# Altium integrated library komponenty_ITS_v1.IntLib: 126 symbols
Pins are listed as number, name and electrical type; pins without a type are passive.

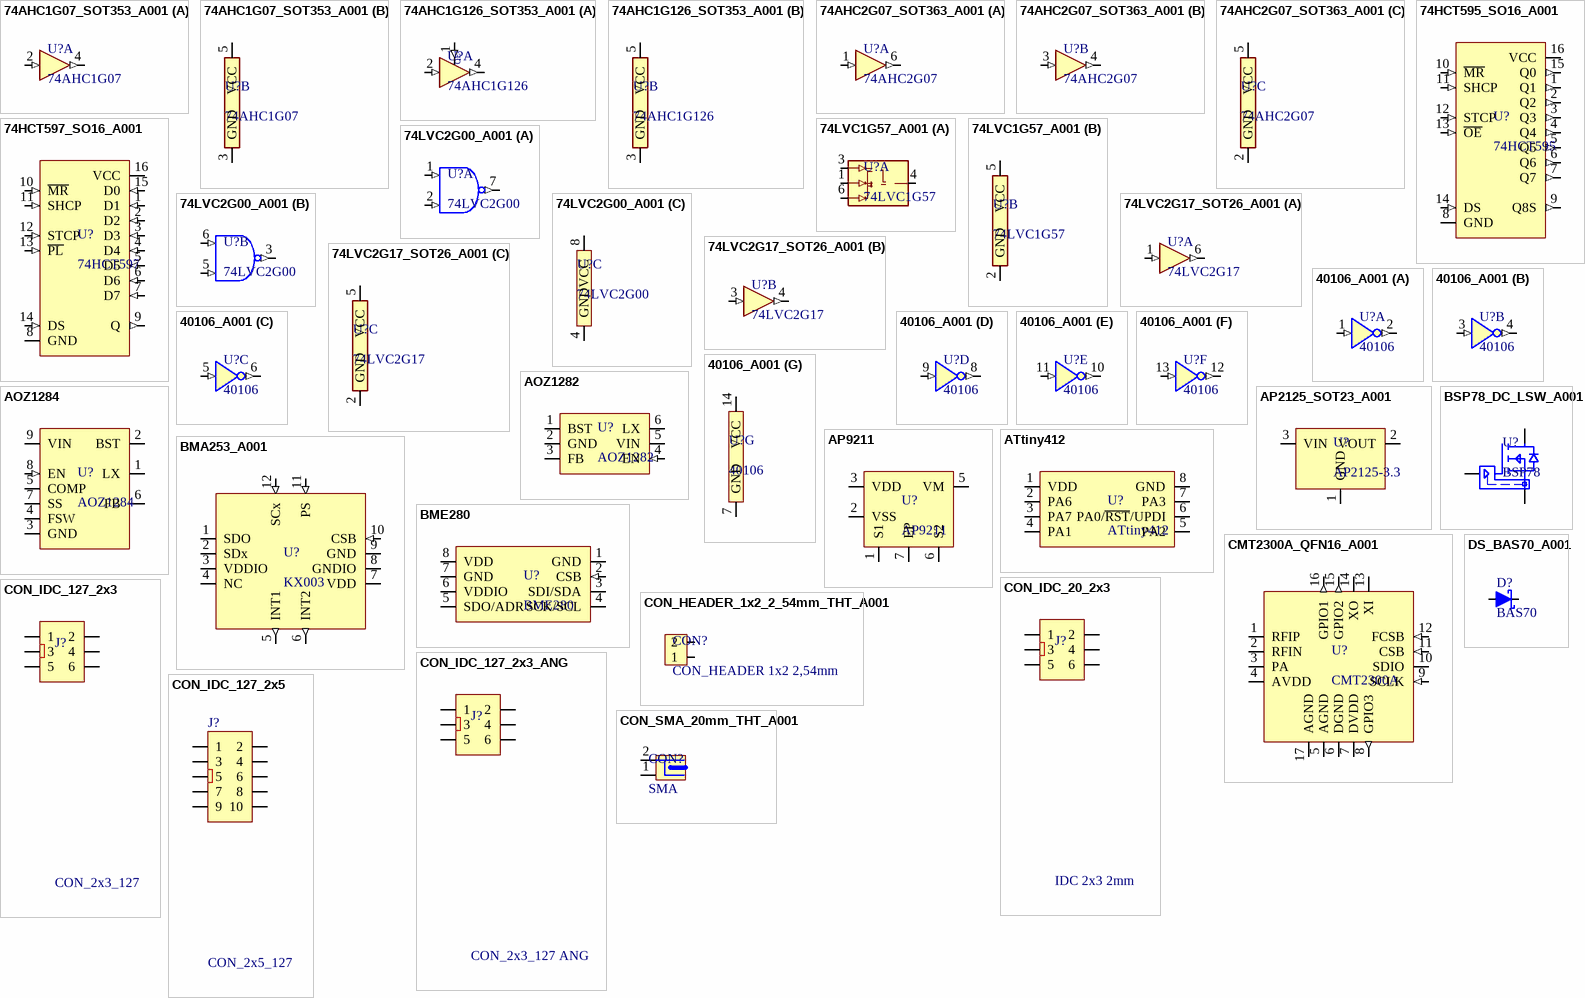
[diagram p0: symbols 74AHC1G07_SOT353_A001 to DS_BAS70_A001]

## 74AHC1G07_SOT353_A001
designator U?, comment 74AHC1G07
buffer OC; ITSN: IC_74AHC1G126_SOT353_A001
footprint SOT353
part A pins: 2 A1 (in), 4 Y1 (out)
part B pins: 3 GND (power), 5 VCC (power)

## 74AHC1G126_SOT353_A001
designator U?, comment 74AHC1G126
buffer with enable; ITSN: IC_74AHC1G126_SOT353_A001
footprint SOT353
part A pins: 1 OE (in), 2 A1 (in), 4 Y1 (out)
part B pins: 3 GND (power), 5 VCC (power)

## 74AHC2G07_SOT363_A001
designator U?, comment 74AHC2G07
2x buffer OC; ITSN: IC_74AHC2G07_SOT363_A001
footprint SOT363
part A pins: 1 A1 (in), 6 Y1 (out)
part B pins: 3 A2 (in), 4 Y2 (out)
part C pins: 2 GND (power), 5 VCC (power)

## 74HCT595_SO16_A001
designator U?, comment 74HCT595
8-b serial to parallel shift register; ITSN: IC_74HCT595_SO16_A001
footprint SO-16 (SOIC, 16-Leads, Body 10,0x4,0mm (max), Pitch 1,27mm, IPC Low Density)
pins: 1 Q1 (out), 2 Q2 (out), 3 Q3 (out), 4 Q4 (out), 5 Q5 (out), 6 Q6 (out), 7 Q7 (out), 8 GND (power), 9 Q8S (out), 10 ~{MR} (in), 11 SHCP (in), 12 STCP (in), 13 ~{OE} (in), 14 DS (in), 15 Q0 (out), 16 VCC (power)

## 74HCT597_SO16_A001
designator U?, comment 74HCT597
8-b parallel  to serial shift register; ITSN: IC_74HCT597_SO16_A001
footprint SO-16 (SOIC, 16-Leads, Body 10,0x4,0mm (max), Pitch 1,27mm, IPC Low Density)
pins: 1 D1 (in), 2 D2 (in), 3 D3 (in), 4 D4 (in), 5 D5 (in), 6 D6 (in), 7 D7 (in), 8 GND (power), 9 Q (out), 10 ~{MR} (in), 11 SHCP (in), 12 STCP (in), 13 ~{PL} (in), 14 DS (in), 15 D0 (in), 16 VCC (power)

## 74LVC1G57_A001
designator U?, comment 74LVC1G57
multiple function gate; ITSN: IC_74LVC1G57GW_SOT363_A001
footprint SOT363
part A pins: 1 B, 3 A, 4 Y, 6 C
part B pins: 2 GND (power), 5 VCC (power)

## 74LVC2G00_A001
designator U?, comment 74LVC2G00
MAND GATE; ITSN: IC_74LVC2G00_VSSOP-8_A001
footprint VSSOP-8
part A pins: 1 A1 (in), 2 B1 (in), 7 OUT_1 (out)
part B pins: 3 OUT_2 (out), 5 B2 (in), 6 A2 (in)
part C pins: 4 GND (power), 8 VCC (power)

## 74LVC2G17_SOT26_A001
designator U?, comment 74LVC2G17
buffer with shmitt; ITSN: IC_74LVC2G17_SOT26_A001
footprint SOT23-6 (Zetex)
part A pins: 1 A1 (in), 6 Y1 (out)
part B pins: 3 A2 (in), 4 Y2 (out)
part C pins: 2 GND (power), 5 VCC (power)

## 40106_A001
designator U?, comment 40106
6 x inverter; ITSN: IC_40106_SO-16_A001
footprint SO-14
part A pins: 1 A1 (in), 2 ~{Y1} (out)
part B pins: 3 A2 (in), 4 ~{Y2} (out)
part C pins: 5 A3 (in), 6 ~{Y3} (out)
part D pins: 8 ~{Y4} (out), 9 A4 (in)
part E pins: 10 ~{Y5} (out), 11 A5 (in)
part F pins: 12 ~{Y6} (out), 13 A6 (in)
part G pins: 7 GND (power), 14 VCC (power)

## AOZ1282
designator U?
DC/DC 1,2A 36V 500kHz SOT23-6; ITSN: IC_AOZ1282_SOT23-6_A001
footprint SOT23-6 (Zetex)
pins: 1 BST, 2 GND (power), 3 FB, 4 EN (in), 5 VIN (power), 6 LX

## AOZ1284
designator U?
3.0V to 36V 4A step-down; ITSN: IC_AOZ1284_SO8EP_A001
footprint SO-8T
pins: 1 LX, 2 BST, 3 GND (power), 4 FSW, 5 COMP, 6 FB, 7 SS, 8 EN (in), 9 VIN (power)

## AP2125_SOT23_A001
designator U?, comment AP2125-3.3
Multi komponent 2.2-3.3 V 100mA Iq<65uA; ITSN: IC_LIN_REG_MULTI_SOT23_A001
footprint SOT-23
pins: 1 GND (power), 2 VOUT (power), 3 VIN (power)

## AP9211
designator U?
single chip protection for 1-CELL Li+ battery; ITSN: IC_AP9211_UDFN-6_A001
footprint U-DFN2030-6 (DIODEC modyfied DFN-6)
pins: 1 S1, 2 VSS (power), 3 VDD (power), 5 VM, 6 S2, 7 EP

## ATtiny412
designator U?
tinyAVR 1-series 4k/256 8pin; ITSN: IC_ATTINY412_A001
footprint SO-8
pins: 1 VDD (power), 2 PA6 (io), 3 PA7 (io), 4 PA1 (io), 5 PA2 (io), 6 PA0/~{RST}/UPDI (io), 7 PA3 (io), 8 GND (power)

## BMA253_A001
designator U?, comment KX003
KX003-1077
footprint LGA-12_ACC_BOSCH (LGA, 12-Leads, Body 2,00x2,00mmx0,70mm, Pitch 0,50mm)
pins: 1 SDO (io), 2 SDx (io), 3 VDDIO, 4 NC, 5 INT1 (out), 6 INT2 (out), 7 VDD (power), 8 GNDIO (power), 9 GND (power), 10 CSB (in), 11 PS (in), 12 SCx (in)

## BME280
designator U?
BME280 BOSCH, humidity, pressure and temperature sensor.; ITSN: IC_BME280_LGA8_A001
footprint LGA_8 (BME280 bosh)
pins: 1 GND (power), 2 CSB (in), 3 SDI/SDA (io), 4 SCK/SCL (io), 5 SDO/ADR (io), 6 VDDIO (power), 7 GND (power), 8 VDD (power)

## BSP78_DC_LSW_A001
designator U?, comment BSP78
Low side protected MOSFET; ITSN: IC_BSP78_SOT223_A001
footprint SOT-223
pins: 1 G, 2 D, 3 S

## CMT2300A_QFN16_A001
designator U?, comment CMT2300A
RF Transciver sub Giga CEMOSTEK CMT2300A QFN16
footprint QFN_16_3x3_A001 (CMOSTEK)
pins: 1 RFIP, 2 RFIN, 3 PA, 4 AVDD (power), 5 AGND (power), 6 DGND (power), 7 DVDD (power), 8 GPIO3 (out), 9 SCLK (in), 10 SDIO (io), 11 CSB (in), 12 FCSB (in), 13 XI, 14 XO, 15 GPIO2 (out), 16 GPIO1 (out), 17 AGND (power)

## CON_HEADER_1x2_2_54mm_THT_A001
designator CON?, comment CON_HEADER 1x2 2,54mm
footprint CON_HEADER_1x2_2.54_THT_A001
pins: 1, 2

## CON_IDC_20_2x3
designator J?, comment IDC 2x3 2mm
IDC THT 2mm 2x3
footprint IDC_2_0_2x3_THT (IDC 2x3 2mm THT)
pins: 1, 2, 3, 4, 5, 6

## CON_IDC_127_2x3
designator J?, comment CON_2x3_127
Connector
footprint IDC_1_27_2x3_SMT (IDC 2x3 1,27 mm SMT OEM)
pins: 1, 2, 3, 4, 5, 6

## CON_IDC_127_2x3_ANG
designator J?, comment CON_2x3_127 ANG
Connector 1,27mm ANG
footprint IDC_1_27_2x3_THT_angle (IDC 2x3 1,27 mm THT angle)
pins: 1, 2, 3, 4, 5, 6

## CON_IDC_127_2x5
designator J?, comment CON_2x5_127
Connector
footprint IDC_1_27_2x5_SMT (IDC 2x5 1,27 mm SMT OEM)
pins: 1, 2, 3, 4, 5, 6, 7, 8, 9, 10

## CON_SMA_20mm_THT_A001
designator CON?, comment SMA
ITSN: CON_SMA_20mm_THT_A001
footprint SMA_THT_20mm_A001
pins: 1, 2

## DS_BAS70_A001
designator D?, comment BAS70
BAS70 Schottky switching diode single, 70mA 70V; ITSN: DS_BAS70_SOD-523_A001
footprint SOD-523
pins: 1 A, 2 K

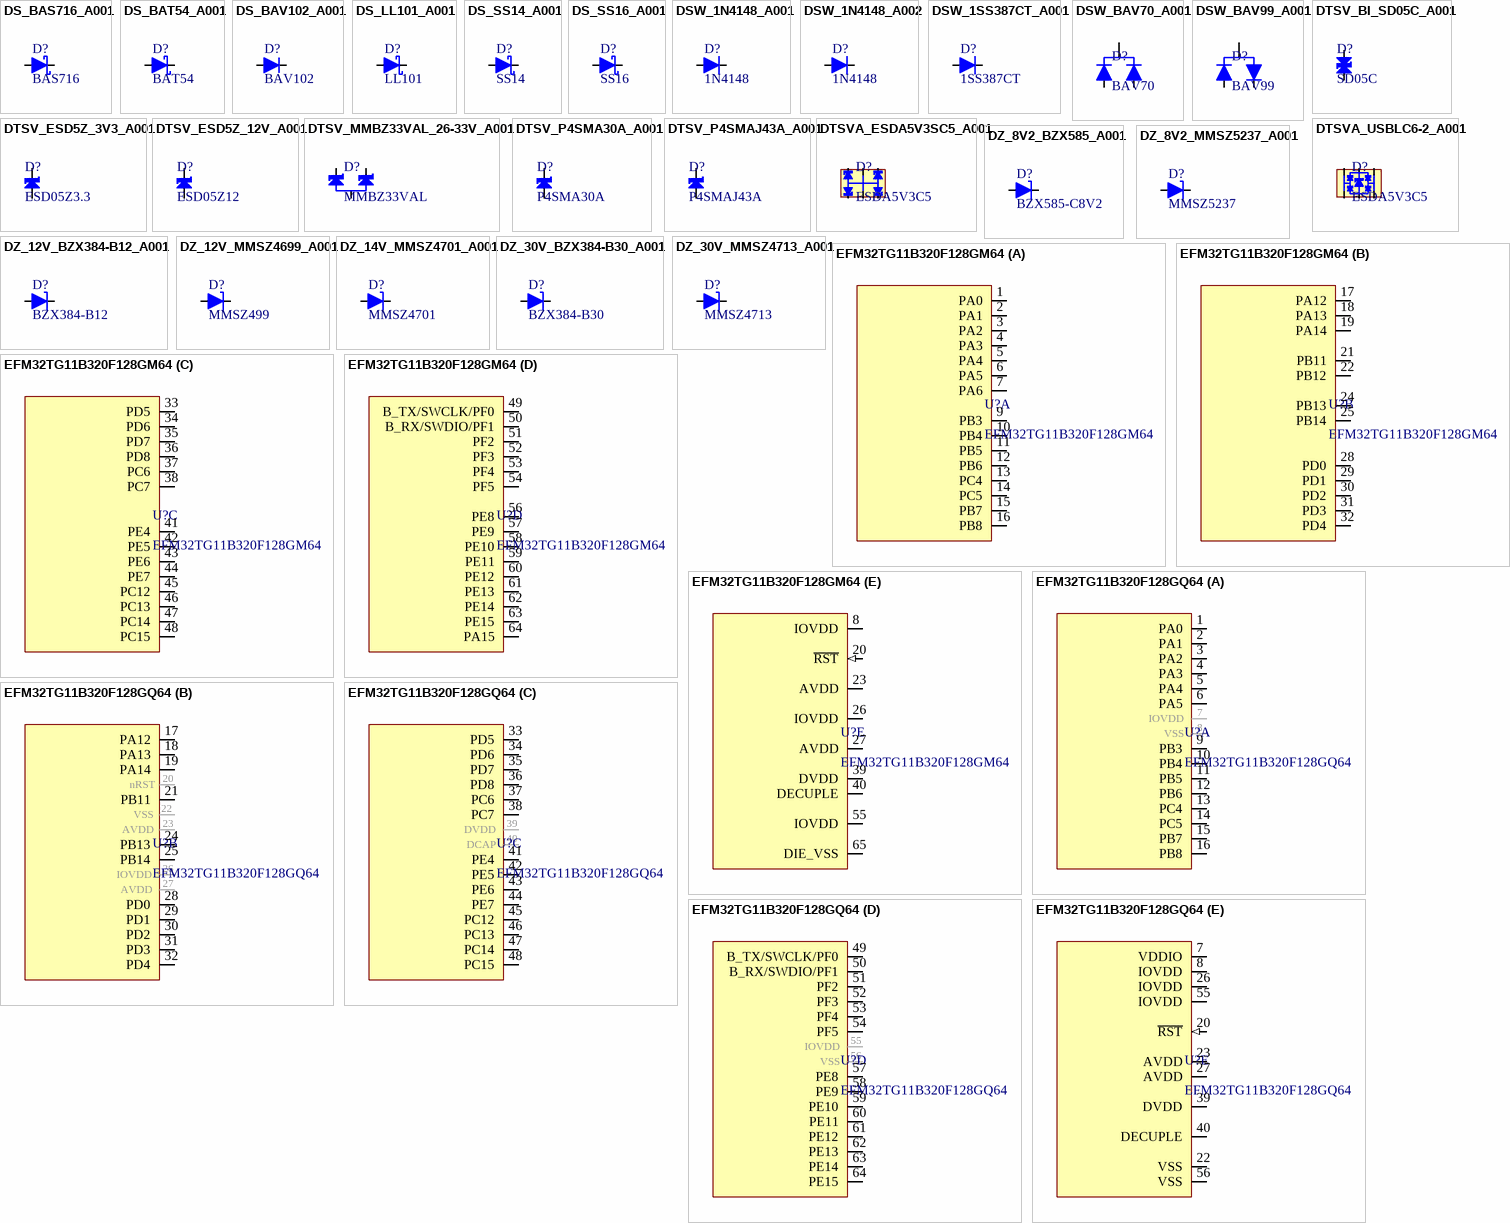
[diagram p1: symbols DS_BAS716_A001 to EFM32TG11B320F128GQ64]

## DS_BAS716_A001
designator D?, comment BAS716
BAS716 low-leakage diode single, 0,2A 75V; ITSN: DS_BAS716_SOD523_A001
footprint SOD-523
pins: 1 A, 2 K

## DS_BAT54_A001
designator D?, comment BAT54
BAT54 Schottky diode single, 0,2A 30V; ITSN: DS_BAT54_SOD523_A001
footprint SOD-523
pins: 1 A, 2 K

## DS_BAV102_A001
designator D?, comment BAV102
BAV102 switching diode 50ns 200V 0,25A; ITSN: DS_BAV102_SOD-80_A001
footprint SOD-80 (miniMELF)
pins: 1 A, 2 K

## DS_LL101_A001
designator D?, comment LL101
LL101 Schottky diode switch 1ns, 15mA 40V; ITSN: DS_LL101_SOD-80_A001
footprint SOD-80 (miniMELF)
pins: 1 A, 2 K

## DS_SS14_A001
designator D?, comment SS14
SS14 Schottky 40V 1A DO214AC (SMA); ITSN: DS_SS14_1A_40V_DO214AC_A001
footprint DO214AC
pins: 1 A, 2 K

## DS_SS16_A001
designator D?, comment SS16
SS16 Schottky 60V 1A DO214AC (SMA); ITSN: DS_SS16_1A_60V_DO214AC_A001
footprint DO214AC
pins: 1 A, 2 K

## DSW_1N4148_A001
designator D?, comment 1N4148
1N4148 75V 150mA; ITSN: DSW_1N4148_SOD523_A001
footprint SOD-523 (SC-79)
pins: 1 A, 2 K

## DSW_1N4148_A002
designator D?, comment 1N4148
1N4148 75V 150mA; ITSN: DSW_1N4148_MicroMELF_A001
footprint microMELF (MELF Diode, 2-Leads, Body 1,90x1,15mm, IPC Medium Density)
pins: 1 A, 2 K

## DSW_1SS387CT_A001
designator D?, comment 1SS387CT
1SS387CT 85V 100mA 1,6ns 0,5pF; ITSN: DSW_1SS387CT_80V_0A2_SOD-882_A001
footprint SOD-882
pins: 1 A, 2 K

## DSW_BAV70_A001
designator D?, comment BAV70
switching diode BAV70 100V 200mA 4ns; ITSN: DSW_BAV70_100V_0A2_SOT23_A001
footprint SOT-23
pins: 1 A1, 2 A2, 3

## DSW_BAV99_A001
designator D?, comment BAV99
switching diode BAV99 100V 200mA 4ns; ITSN: DSW_BAV99_100V_0A2_SOT23_A001
footprint SOT-23
pins: 1 A, 2 K, 3

## DTSV_BI_SD05C_A001
designator D?, comment SD05C
Single Line TVS Diode  5V; ITSN: DTSV_SD05C_BI_5V_24A_SOD-323_A001
footprint SOD-323
pins: 1, 2

## DTSV_ESD5Z_3V3_A001
designator D?, comment ESD05Z3.3
3V3 Single Line TVS Diode; ITSN: DTSV_ESD5Z3.3_3V3_11A2_SOD-523_A001
footprint SOD-523
pins: 1 A, 2 K

## DTSV_ESD5Z_12V_A001
designator D?, comment ESD05Z12
12V Single Line TVS Diode; ITSN: DTSV_ESD5Z12T1G_12V_9A_SOD-523_A001
footprint SOD-523
pins: 1 A, 2 K

## DTSV_MMBZ33VAL_26-33V_A001
designator D?, comment MMBZ33VAL
26-33V Dual Line TVS Diode; ITSN: DTSV_MMBZ33_26-33V_SOT23_A001
footprint SOT-23
pins: 1 K, 2 K, 3 CA

## DTSV_P4SMA30A_A001
designator D?, comment P4SMA30A
Single Line TVS Diode  30V 10A; ITSN: DTSV_P4SMA30A_30V_DO214AC_A001
footprint DO214AC
pins: 1 A, 2 K

## DTSV_P4SMAJ43A_A001
designator D?, comment P4SMAJ43A
Single Line TVS Diode  43V 10A; ITSN: DTSV_P4SMAJ43A_43V_DO214AC_A001
footprint DO214AC
pins: 1 A, 2 K

## DTSVA_ESDA5V3SC5_A001
designator D?, comment ESDA5V3C5
Quad TSV array 5V3; ITSN: DTSVA_ESDA5V3SC5_5V9_22A_SOT23-6_A001
footprint SOT23-6 (Zetex)
pins: 1, 2, 3, 4, 5, 6

## DTSVA_USBLC6-2_A001
designator D?, comment ESDA5V3C5
Quad TSV array 5V3; ITSN: DTSVA_USBLC6_SOT-26_A001
footprint SOT23-6 (Zetex)
pins: 1, 2, 3, 4, 5, 6

## DZ_8V2_BZX585_A001
designator D?, comment BZX585-C8V2
8V2 Zener, SOD-523; ITSN: DZ_8V2_BZX585_SOD-523_A001
footprint SOD-523 (SC-79)
pins: 1 A, 2 K

## DZ_8V2_MMSZ5237_A001
designator D?, comment MMSZ5237
8V2 Zener, SOD-323; ITSN: DZ_8V2_MMSZ5237_SOD323_A001
footprint SOD-323
pins: 1 A, 2 K

## DZ_12V_BZX384-B12_A001
designator D?, comment BZX384-B12
12V Zener Iz=50uA SOD-323; ITSN: DZ_12V_BZX384_SOD323_A001
footprint SOD-323
pins: 1 A, 2 K

## DZ_12V_MMSZ4699_A001
designator D?, comment MMSZ499
12V Zener Iz=50uA SOD-123; ITSN: DZ_12V_MMSZ4699_SOD-123_A001
footprint SOD-123
pins: 1 A, 2 K

## DZ_14V_MMSZ4701_A001
designator D?, comment MMSZ4701
14V Zener Iz=50uA SOD-123; ITSN: DZ_14V_MMSZ4701_SOD-123_A001
footprint SOD-123
pins: 1 A, 2 K

## DZ_30V_BZX384-B30_A001
designator D?, comment BZX384-B30
30V Zener Iz=50uA SOD-323; ITSN: DZ_30V_BZX384_SOD323_A001
footprint SOD-323
pins: 1 A, 2 K

## DZ_30V_MMSZ4713_A001
designator D?, comment MMSZ4713
30V Zener Iz=50uA SOD-123; ITSN: DZ_30V_MMSZ4713_SOD-123_A001
footprint SOD-123
pins: 1 A, 2 K

## EFM32TG11B320F128GM64
designator U?
EFM32TG11 FAMILY: EFM32TG11B3XX; ITSN: IC_EFM32TG11B320_QFN64_A001
footprint QFN64_A001 (GECO SILICON LABS)
part A pins: 1 PA0 (io), 2 PA1 (io), 3 PA2 (io), 4 PA3 (io), 5 PA4 (io), 6 PA5 (io), 7 PA6 (io), 9 PB3 (io), 10 PB4 (io), 11 PB5 (io), 12 PB6 (io), 13 PC4 (io), 14 PC5 (io), 15 PB7 (io), 16 PB8 (io)
part B pins: 17 PA12 (io), 18 PA13 (io), 19 PA14 (io), 21 PB11 (io), 22 PB12 (io), 24 PB13 (io), 25 PB14 (io), 28 PD0 (io), 29 PD1 (io), 30 PD2 (io), 31 PD3 (io), 32 PD4 (io)
part C pins: 33 PD5 (io), 34 PD6 (io), 35 PD7 (io), 36 PD8 (io), 37 PC6 (io), 38 PC7 (io), 41 PE4 (io), 42 PE5 (io), 43 PE6 (io), 44 PE7 (io), 45 PC12 (io), 46 PC13 (io), 47 PC14 (io), 48 PC15 (io)
part D pins: 49 B_TX/SWCLK/PF0 (io), 50 B_RX/SWDIO/PF1 (io), 51 PF2 (io), 52 PF3 (io), 53 PF4 (io), 54 PF5 (io), 56 PE8 (io), 57 PE9 (io), 58 PE10 (io), 59 PE11 (io), 60 PE12 (io), 61 PE13 (io), 62 PE14 (io), 63 PE15 (io), 64 PA15 (io)
part E pins: 8 IOVDD (power), 20 ~{RST} (in), 23 AVDD (power), 26 IOVDD (power), 27 AVDD (power), 39 DVDD (power), 40 DECUPLE, 55 IOVDD (power), 65 DIE_VSS

## EFM32TG11B320F128GQ64
designator U?
EFM32TG11 FAMILY: EFM32TG11B3XX LQFP64; ITSN: IC_EFM32TG11B320_QFP64_A001
footprint LQFP64_small (TSQFP, 64-Leads, Body 10,00x10,00mm, Pitch 0,50mm)
part A pins: 1 PA0 (io), 2 PA1 (io), 3 PA2 (io), 4 PA3 (io), 5 PA4 (io), 6 PA5 (io), 9 PB3 (io), 10 PB4 (io), 11 PB5 (io), 12 PB6 (io), 13 PC4 (io), 14 PC5 (io), 15 PB7 (io), 16 PB8 (io)
part B pins: 17 PA12 (io), 18 PA13 (io), 19 PA14 (io), 21 PB11 (io), 24 PB13 (io), 25 PB14 (io), 28 PD0 (io), 29 PD1 (io), 30 PD2 (io), 31 PD3 (io), 32 PD4 (io)
part C pins: 33 PD5 (io), 34 PD6 (io), 35 PD7 (io), 36 PD8 (io), 37 PC6 (io), 38 PC7 (io), 41 PE4 (io), 42 PE5 (io), 43 PE6 (io), 44 PE7 (io), 45 PC12 (io), 46 PC13 (io), 47 PC14 (io), 48 PC15 (io)
part D pins: 49 B_TX/SWCLK/PF0 (io), 50 B_RX/SWDIO/PF1 (io), 51 PF2 (io), 52 PF3 (io), 53 PF4 (io), 54 PF5 (io), 57 PE8 (io), 58 PE9 (io), 59 PE10 (io), 60 PE11 (io), 61 PE12 (io), 62 PE13 (io), 63 PE14 (io), 64 PE15 (io)
part E pins: 7 VDDIO (power), 8 IOVDD (power), 20 ~{RST} (in), 22 VSS (power), 23 AVDD (power), 26 IOVDD (power), 27 AVDD (power), 39 DVDD (power), 40 DECUPLE, 55 IOVDD (power), 56 VSS (power)
part B text: nRST
part C text: DCAP

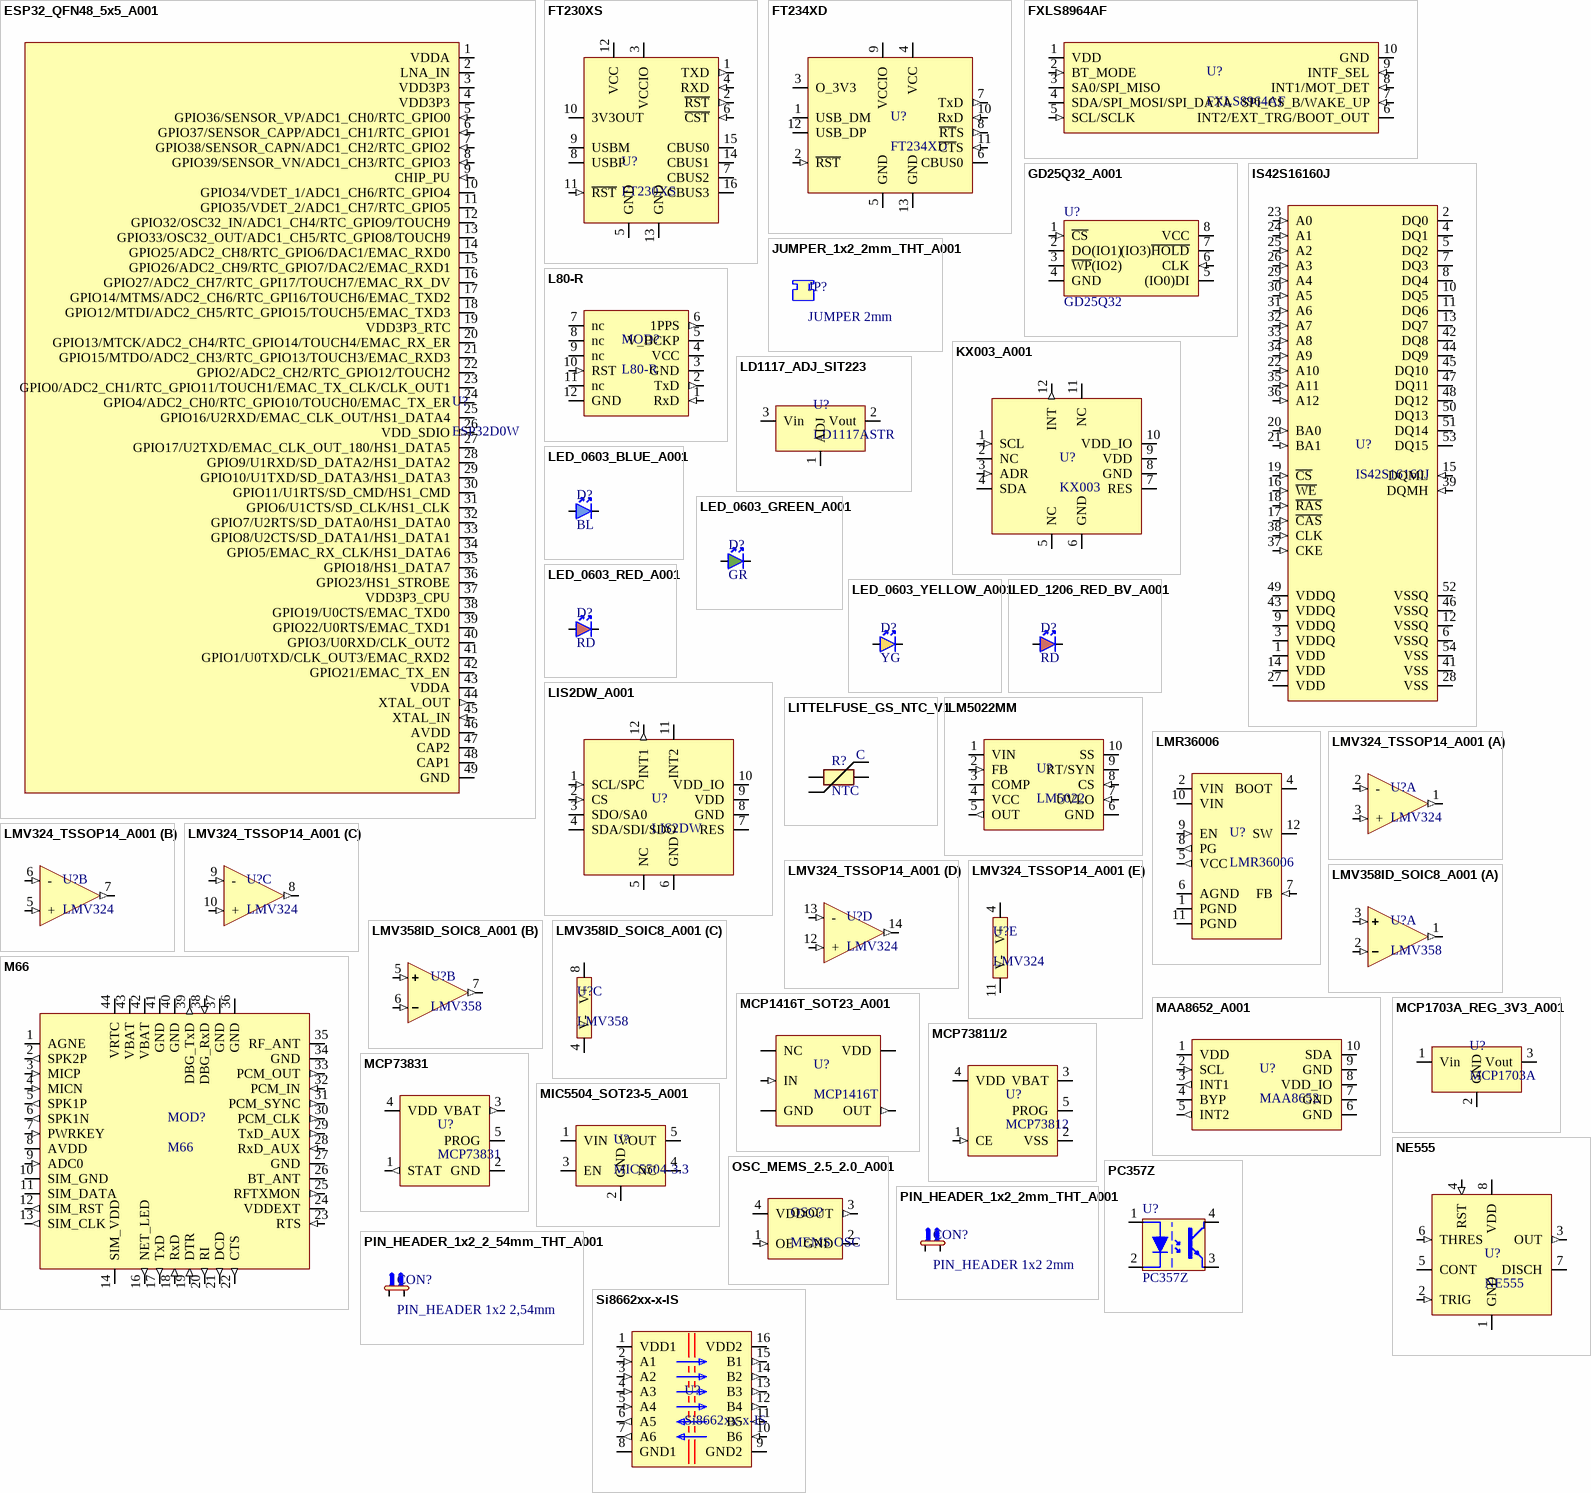
[diagram p2: symbols ESP32_QFN48_5x5_A001 to Si8662xx-x-IS]

## ESP32_QFN48_5x5_A001
designator U?, comment ESP32D0W
ESP32 QFN48 5x5; ITSN: IC_ESP32D0W_QFN48_A001
footprint QFN48_5_5_v1 (QFN48 5x5)
pins: 1 VDDA (power), 2 LNA_IN, 3 VDD3P3 (power), 4 VDD3P3 (power), 5 GPIO36/SENSOR_VP/ADC1_CH0/RTC_GPIO0 (in), 6 GPIO37/SENSOR_CAPP/ADC1_CH1/RTC_GPIO1 (in), 7 GPIO38/SENSOR_CAPN/ADC1_CH2/RTC_GPIO2 (in), 8 GPIO39/SENSOR_VN/ADC1_CH3/RTC_GPIO3 (in), 9 CHIP_PU (in), 10 GPIO34/VDET_1/ADC1_CH6/RTC_GPIO4 (io), 11 GPIO35/VDET_2/ADC1_CH7/RTC_GPIO5 (io), 12 GPIO32/OSC32_IN/ADC1_CH4/RTC_GPIO9/TOUCH9 (io), 13 GPIO33/OSC32_OUT/ADC1_CH5/RTC_GPIO8/TOUCH9 (io), 14 GPIO25/ADC2_CH8/RTC_GPIO6/DAC1/EMAC_RXD0 (io), 15 GPIO26/ADC2_CH9/RTC_GPIO7/DAC2/EMAC_RXD1 (io), 16 GPIO27/ADC2_CH7/RTC_GPI17/TOUCH7/EMAC_RX_DV (io), 17 GPIO14/MTMS/ADC2_CH6/RTC_GPI16/TOUCH6/EMAC_TXD2 (io), 18 GPIO12/MTDI/ADC2_CH5/RTC_GPIO15/TOUCH5/EMAC_TXD3 (io), 19 VDD3P3_RTC (power), 20 GPIO13/MTCK/ADC2_CH4/RTC_GPIO14/TOUCH4/EMAC_RX_ER (io), 21 GPIO15/MTDO/ADC2_CH3/RTC_GPIO13/TOUCH3/EMAC_RXD3 (io), 22 GPIO2/ADC2_CH2/RTC_GPIO12/TOUCH2 (io), 23 GPIO0/ADC2_CH1/RTC_GPIO11/TOUCH1/EMAC_TX_CLK/CLK_OUT1 (io), 24 GPIO4/ADC2_CH0/RTC_GPIO10/TOUCH0/EMAC_TX_ER (io), 25 GPIO16/U2RXD/EMAC_CLK_OUT/HS1_DATA4 (io), 26 VDD_SDIO (out) "OUTPUT 1V8 OR VDD3P3_RTC", 27 GPIO17/U2TXD/EMAC_CLK_OUT_180/HS1_DATA5 (io), 28 GPIO9/U1RXD/SD_DATA2/HS1_DATA2 (io), 29 GPIO10/U1TXD/SD_DATA3/HS1_DATA3 (io), 30 GPIO11/U1RTS/SD_CMD/HS1_CMD (io), 31 GPIO6/U1CTS/SD_CLK/HS1_CLK (io), 32 GPIO7/U2RTS/SD_DATA0/HS1_DATA0 (io), 33 GPIO8/U2CTS/SD_DATA1/HS1_DATA1 (io), 34 GPIO5/EMAC_RX_CLK/HS1_DATA6 (io), 35 GPIO18/HS1_DATA7 (io), 36 GPIO23/HS1_STROBE (io), 37 VDD3P3_CPU (power), 38 GPIO19/U0CTS/EMAC_TXD0 (io), 39 GPIO22/U0RTS/EMAC_TXD1 (io), 40 GPIO3/U0RXD/CLK_OUT2 (io), 41 GPIO1/U0TXD/CLK_OUT3/EMAC_RXD2 (io), 42 GPIO21/EMAC_TX_EN (io), 43 VDDA (power), 44 XTAL_OUT (out), 45 XTAL_IN (in), 46 AVDD (power), 47 CAP2, 48 CAP1, 49 GND

## FT230XS
designator U?
ITSN: IC_FT230XS_SSOP16_A001
footprint SSOP-16_v2 (smoller)
pins: 1 TXD (out), 2 ~{RST} (out), 3 VCCIO (power), 4 RXD (in), 5 GND (power), 6 ~{CST} (in), 7 CBUS2 (io), 8 USBP, 9 USBM, 10 3V3OUT (power), 11 ~{RST} (in), 12 VCC (power), 13 GND (power), 14 CBUS1 (io), 15 CBUS0 (io), 16 CBUS3 (io)

## FT234XD
designator U?
FTDI FT234XD USART bridge; ITSN: IC_FT234XD_DFN-12_A001
footprint DFN-12 (FTDI DFN-12)
pins: 1 USB_DM, 2 ~{RST} (in), 3 O_3V3 (power), 4 VCC (power), 5 GND (power), 6 CBUS0 (io), 7 TxD (out), 8 ~{RT}S (out), 9 VCCIO (power), 10 RxD (in), 11 ~{CT}S (in), 12 USB_DP, 13 GND (power)

## FXLS8964AF
designator U?
NXP acc low power; ITSN: nn
footprint DFN-10_ACC (PQFN, 10-Leads, Body 2,00x2,00mm, Pitch 0,40mm, Thermal Pad 0,50x0,50mm, IPC Medium Density)
pins: 1 VDD (power), 2 BT_MODE (in), 3 SA0/SPI_MISO (io), 4 SDA/SPI_MOSI/SPI_DATA (io), 5 SCL/SCLK (in), 6 INT2/EXT_TRG/BOOT_OUT (io), 7 SPI_CS_B/WAKE_UP (in), 8 INT1/MOT_DET (in), 9 INTF_SEL (in), 10 GND (power)

## GD25Q32_A001
designator U?, comment GD25Q32
SPI flash; ITSN: IC_GD25Q32_SO8_A001
footprint SOIC-8_208 _150 (150 - 208mm soic 8 package FLASH)
pins: 1 ~{CS} (in), 2 DO(IO1) (io), 3 ~{WP}(IO2) (io), 4 GND (power), 5 (IO0)DI (io), 6 CLK (in), 7 (IO3)~{HOLD} (io), 8 VCC (power)

## IS42S16160J
designator U?
SDRAM TSOP 54 standard
footprint TSOP-54 (TSOP, 54-Leads, Body 22,22x10,16mm, Pitch 0,80mm, IPC Medium Density)
pins: 1 VDD (power), 2 DQ0 (io), 3 VDDQ (power), 4 DQ1 (io), 5 DQ2 (io), 6 VSSQ (power), 7 DQ3 (io), 8 DQ4 (io), 9 VDDQ (power), 10 DQ5 (io), 11 DQ6 (io), 12 VSSQ (power), 13 DQ7 (io), 14 VDD (power), 15 DQML (in), 16 ~{WE} (in), 17 ~{CAS} (in), 18 ~{RAS} (in), 19 ~{CS} (in), 20 BA0 (in), 21 BA1 (in), 22 A10 (in), 23 A0 (in), 24 A1 (in), 25 A2 (in), 26 A3 (in), 27 VDD (power), 28 VSS (power), 29 A4 (in), 30 A5 (in), 31 A6 (in), 32 A7 (in), 33 A8 (in), 34 A9 (in), 35 A11 (in), 36 A12 (in), 37 CKE (in), 38 CLK (in), 39 DQMH (in), 41 VSS (power), 42 DQ8 (io), 43 VDDQ (power), 44 DQ9 (io), 45 DQ10 (io), 46 VSSQ (power), 47 DQ11 (io), 48 DQ12 (io), 49 VDDQ (power), 50 DQ13 (io), 51 DQ14 (io), 52 VSSQ (power), 53 DQ15 (io), 54 VSS (power)

## JUMPER_1x2_2mm_THT_A001
designator JP?, comment JUMPER 2mm
footprint JUMPER_2_A001

## KX003_A001
designator U?, comment KX003
KX003-1077; ITSN: IC_KX003_LGA12_A001
footprint LGA-12_ACC (LGA, 12-Leads, Body 2,00x2,00mmx0,70mm, Pitch 0,50mm)
pins: 1 SCL (in), 2 NC, 3 ADR (in), 4 SDA (io), 5 NC, 6 GND (power), 7 RES, 8 GND (power), 9 VDD (power), 10 VDD_IO (power), 11 NC, 12 INT (out)

## L80-R
designator MOD?
ITSN: MOD_GPS_L80_A001
footprint L80-R
pins: 1 RxD (in), 2 TxD (out), 3 GND (power), 4 VCC (power), 5 V_BCKP (power), 6 1PPS (out), 7 nc, 8 nc, 9 nc, 10 RST (in), 11 nc, 12 GND (power)

## LD1117_ADJ_SIT223
designator U?, comment LD1117ASTR
ADJ LD1117 SOT223; ITSN: IC_LD1117_ADJ_SOT223_A001
footprint SOT-223
pins: 1 ADJ, 2 Vout, 3 Vin

## LED_0603_BLUE_A001
designator D?, comment BL
LED 0603 Blue , regular; ITSN: LED_0603_BLUE_A001
footprint 0603_LED_BL (0603 LED Blue)
pins: 1 A, 2 K